# Altium footprint library CMRat_GEN2.8.PcbLib: 50 footprints (part 1 of 4)
Each footprint in its own frame and in the unit in brackets; x right, y up, seen from the top. Pads: shape width x height; smd on the part's side, far side on the other; paste and mask are expansions set on the pad; w line width, h text height; cw(c..) or ccw(c..) is an arc to the next point about the centre after c.
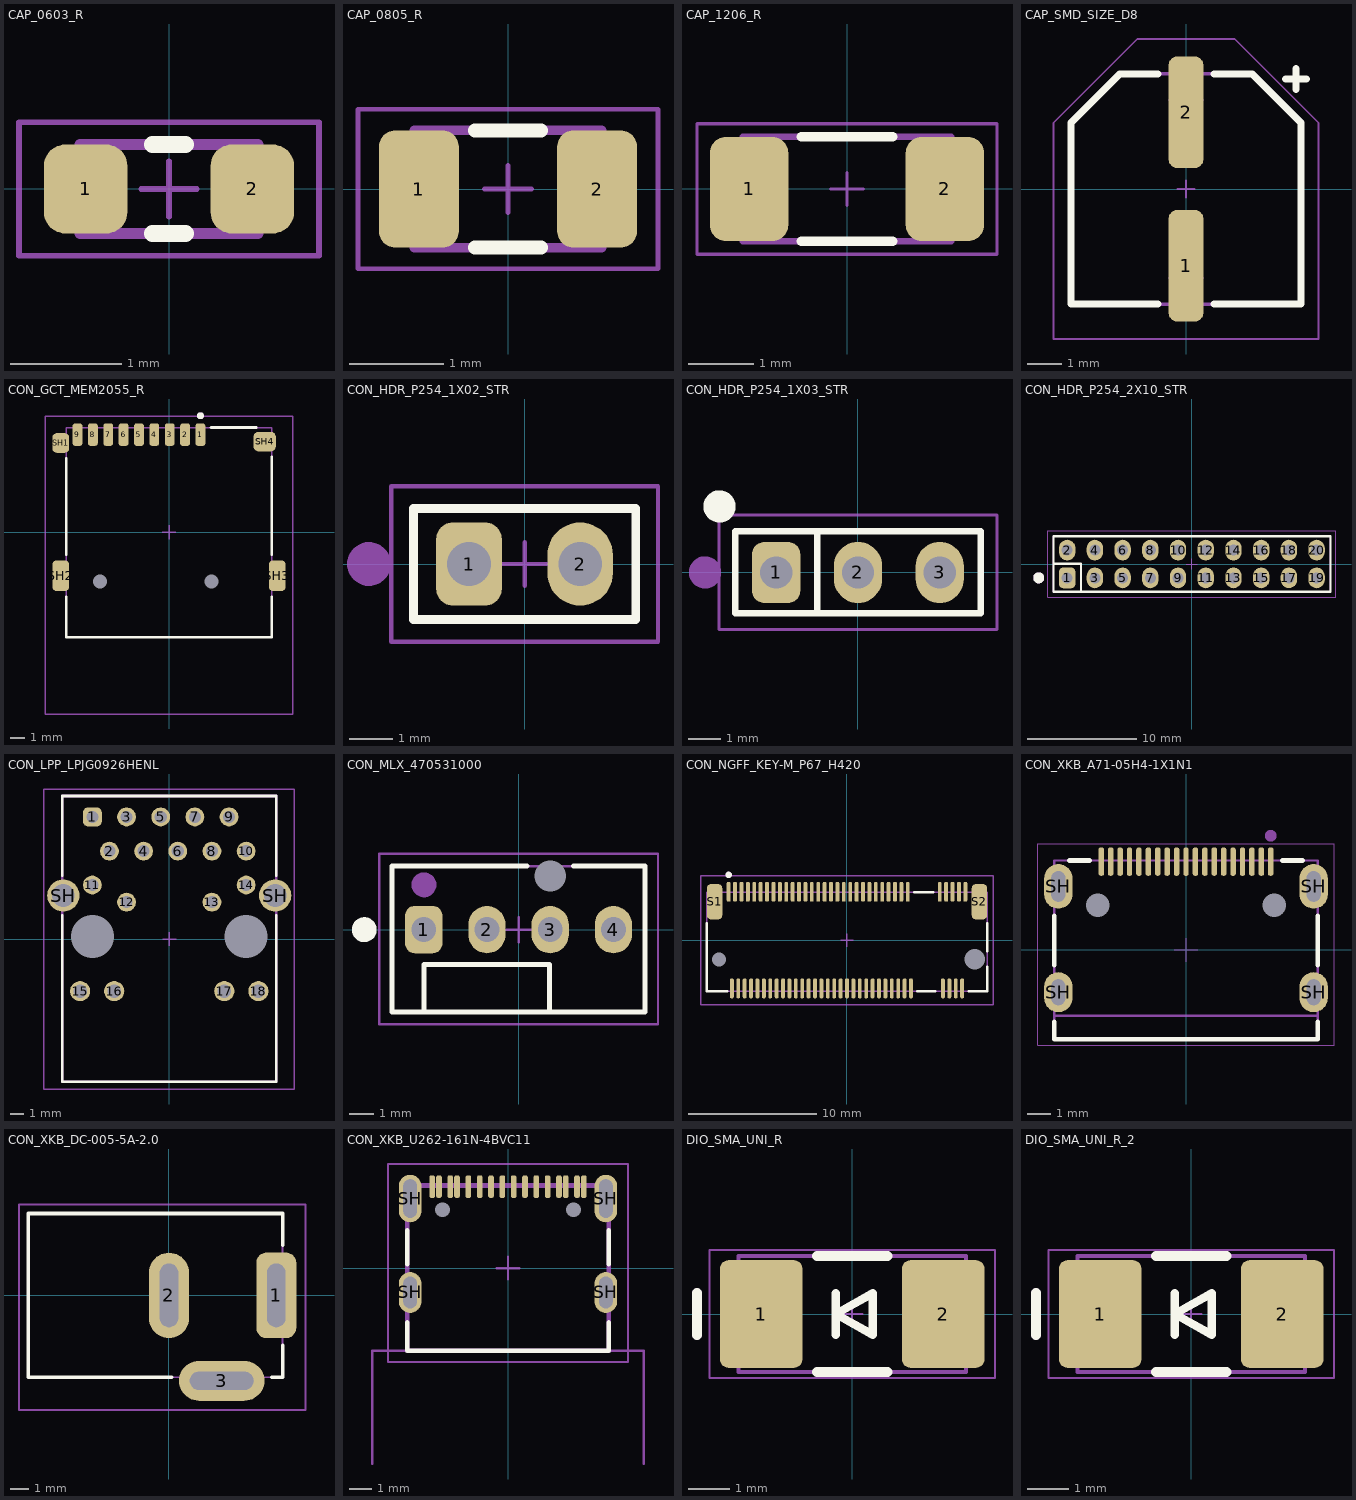
[diagram p0: the footprints below, top view; thin cyan lines are the x and y axes]

## CAP_0603_R [mm]
height 10.7
pads (2):
  rrect50% 0.75x0.8 smd: 1(-0.75,0) 2(0.75,0)
Top Overlay:
  lines w0.15: -0.15,-0.4 0.15,-0.4 ; -0.15,0.4 0.15,0.4
Mechanical 19:
  lines w0.1: -0.8,-0.4 -0.8,0.4 0.8,0.4 0.8,-0.4 -0.8,-0.4
  text ".Designator" at 0.95,-0.65 h1
Mechanical 23:
  lines w0.05: -0.25,0 0.25,0 ; 0,-0.25 0,0.25 ; -1.35,-0.6 -1.35,0.6 1.35,0.6 1.35,-0.6 -1.35,-0.6
3D body "CAPC1608X_0603.step": height 0.57, standoff 0, extent -0.8,-0.41 0.8,0.41

## CAP_0805_R [mm]
height 10.7
pads (2):
  rrect40% 0.85x1.25 smd: 1(-0.95,0) 2(0.95,0)
Top Overlay:
  lines w0.15: -0.35,-0.625 0.35,-0.625 ; -0.35,0.625 0.35,0.625
Mechanical 19:
  lines w0.1: -1,-0.625 -1,0.625 1,0.625 1,-0.625 -1,-0.625
  text ".Designator" at -1,1.05 h1
Mechanical 23:
  lines w0.05: -0.25,0 0.25,0 ; 0,-0.25 0,0.25 ; -1.6,-0.85 -1.6,0.85 1.6,0.85 1.6,-0.85 -1.6,-0.85
3D body "CAP0805.step": height 0.6, standoff 0, extent -1,-0.625 1,0.625

## CAP_1206_R [mm]
pads (2):
  rrect40% 1.2x1.6 smd paste+0: 1(-1.5,0)
  rrect40% 1.2x1.6 smd: 2(1.5,0)
Top Overlay:
  lines w0.15: -0.7,-0.8 0.7,-0.8 ; -0.7,0.8 0.7,0.8
Mechanical 19:
  lines w0.1: -1.6,-0.8 1.6,-0.8 1.6,0.8 -1.6,0.8 -1.6,-0.8
  text ".Designator" at -2.65,0.85 h1
Mechanical 23:
  lines w0.05: -0.25,0 0.25,0 ; 0,-0.25 0,0.25 ; -2.3,-1 -2.3,1 2.3,1 2.3,-1 -2.3,-1
3D body "CAP1206.step": height 0.79, standoff 0.01, extent -1.6,-0.8 1.6,0.8

## CAP_SMD_SIZE_D8 [mm]
height 10.7
pads (2):
  rrect50% 1x3.2 smd: 1(0,-2.2) 2(0,2.2)
Top Overlay:
  lines w0.2: -0.8,-3.3 -3.3,-3.3 -3.3,1.9 -1.9,3.3 -0.8,3.3 ; 0.8,-3.3 3.3,-3.3 3.3,1.9 1.9,3.3 0.8,3.3 ; 2.85,3.15 3.45,3.15 ; 3.15,2.85 3.15,3.45
Mechanical 19:
  lines w0.1: -3.3,-3.3 3.3,-3.3 3.3,1.9 1.9,3.3 -1.9,3.3 -3.3,1.9 -3.3,-3.3
  lines w0.2: -0.4,-2.55 0.4,-2.55 ; -0.4,2.55 0.4,2.55 ; 0,2.15 0,2.95
  text ".Designator" at 1.35,0.45 h1.4
Mechanical 23:
  lines w0.05: -0.25,0 0.25,0 ; 0,-0.25 0,0.25 ; -3.8,-4.3 3.8,-4.3 3.8,1.9 1.4,4.3 -1.4,4.3 -3.8,1.9 -3.8,-4.3
3D body "CAP Size D8.step": height 7.71, standoff -0.01, extent -3.3,-3.5 3.3,3.5

## CON_GCT_MEM2055_R [mm]
pads (15):
  rrect50% 0.7x1.6 smd: 1(2.25,7) 2(1.15,7) 3(0.05,7) 4(-1.05,7) 5(-2.15,7) 6(-3.25,7) 7(-4.35,7) 8(-5.45,7) 9(-6.55,7)
  round 0 hole 1 unplated paste+0 mask+0.1: MH(-4.95,-3.5) MH(3.05,-3.5)
  rrect50% 1.2x1.4 smd: SH1(-7.75,6.4)
  rrect50% 1.2x2.2 smd: SH2(-7.75,-3.1) SH3(7.75,-3.1)
  rrect50% 1.6x1.4 smd: SH4(6.85,6.5)
Top Overlay:
  circle w0.25: c2.25,8.35 r0.125
  lines w0.2: -7.35,-4.6 -7.35,-7.5 7.35,-7.5 7.35,-4.6 ; -7.35,-1.6 -7.35,5.3 ; 3,7.5 6.25,7.5 ; 7.35,-1.6 7.35,5.4
Mechanical 19:
  circle w0.25: c2.25,8.35 r0.125
  lines w0.1: -7.35,-7.5 -7.35,7.5 7.35,7.5 7.35,-7.5 -7.35,-7.5
  text ".Designator" at -2.1,-9.3 h2
Mechanical 23:
  lines w0.1: -0.5,0 0.5,0 ; 0,-0.5 0,0.5 ; -8.85,-13 -8.85,8.3 8.85,8.3 8.85,-13 -8.85,-13
3D body "GCT_MEM2055-00-190-01-A_revG.step": height 1.85, standoff -0.6, extent -8,-7.5 8,7.75

## CON_HDR_P254_1X02_STR [mm]
height 7.12
pads (2):
  rrect50% 1.5x1.9 hole 1: 1(-1.27,0)
  oval 1.5x1.9 hole 1: 2(1.27,0)
Top Overlay:
  lines w0.2: -2.54,-1.27 2.54,-1.27 2.54,1.27 -2.54,1.27 -2.54,-1.27
Mechanical 21:
  circle w0.5: c-3.556,0 r0.25
  lines w0.1: -2.54,-1.27 -2.54,1.27 2.54,1.27 2.54,-1.27 -2.54,-1.27
  text ".Designator" at 1.75,-1.6 h2
Mechanical 23:
  lines w0.1: -0.5,0 0.5,0 ; 0,-0.5 0,0.5 ; -3.048,-1.778 3.048,-1.778 3.048,1.778 -3.048,1.778 -3.048,-1.778
3D body "Pin Header 1X2.step": height 8.57, standoff -2.97, extent -2.54,-1.27 2.54,1.27

## CON_HDR_P254_1X03_STR [mm]
height 13.25
pads (3):
  rrect50% 1.5x1.9 hole 1: 1(-2.54,0)
  oval 1.5x1.9 hole 1: 2(0,0) 3(2.54,0)
Top Overlay:
  circle w0.5: c-4.3,2.05 r0.25
  lines w0.2: -1.27,-1.27 -1.27,1.27 ; -3.81,-1.27 -3.81,1.28 3.81,1.28 3.81,-1.27 -3.81,-1.27
Mechanical 21:
  circle w0.5: c-4.75,0 r0.25
  lines w0.1: -3.81,1.27 3.81,1.27 3.81,-1.27 -3.81,-1.27 -3.81,1.275 ; -1.27,-1.27 -1.27,1.275
  text ".Designator" at 1.6,-1.5 h1.5
Mechanical 23:
  lines w0.1: -0.5,0 0.5,0 ; 0,-0.5 0,0.5 ; -4.318,-1.773 -4.318,1.783 4.318,1.783 4.318,-1.773 -4.318,-1.773
3D body "Wurth_61300311121.stp": height 8.57, standoff -2.97, extent -3.81,-1.27 3.81,1.27

## CON_HDR_P254_2X10_STR [mm]
pads (20):
  rrect50% 1.5x1.9 hole 1: 1(-11.43,-1.275)
  oval 1.5x1.9 hole 1: 2(-11.43,1.275) 3(-8.89,-1.275) 4(-8.89,1.275) 5(-6.35,-1.275) 6(-6.35,1.275) 7(-3.81,-1.275) 8(-3.81,1.275) 9(-1.27,-1.275) 10(-1.27,1.275) 11(1.27,-1.275) 12(1.27,1.275) 13(3.81,-1.275) 14(3.81,1.275) 15(6.35,-1.275) 16(6.35,1.275) 17(8.89,-1.27) 18(8.89,1.275) 19(11.43,-1.275) 20(11.43,1.275)
Top Overlay:
  circle w0.5: c-14.04,-1.27 r0.25
  lines w0.2: -12.68,0.025 -10.18,0.025 ; -10.16,-2.545 -10.16,-0.005 ; 12.7,-2.555 12.7,2.535 ; 12.7,-2.545 -12.7,-2.545 -12.7,2.545 12.7,2.545
Mechanical 21:
  circle w0.5: c-14.04,-1.27 r0.25
  lines w0.1: -12.695,0 -10.16,0 -10.16,-2.545 ; 12.7,-2.555 12.7,2.525 ; 12.7,-2.545 -12.7,-2.545 -12.7,2.535 12.7,2.535
  text ".Designator" at -2.4,2.805 h2
Mechanical 23:
  lines w0.1: -0.5,0 0.5,0 ; 0,-0.5 0,0.5 ; 13.19,3.048 -13.208,3.048 -13.208,-3.048 13.208,-3.048 13.208,3.038
3D body "61302021121.stp": height 8.59, standoff -2.95, extent -12.7,-2.54 12.7,2.54

## CON_LPP_LPJG0926HENL [mm]
height 13.3
pads (22):
  rrect50% 1.4x1.4 hole 0.9: 1(-5.721,9.073)
  round 1.4 hole 0.9: 2(-4.451,6.533) 3(-3.181,9.073) 4(-1.911,6.533) 5(-0.641,9.073) 6(0.629,6.533) 7(1.899,9.073) 8(3.169,6.533) 9(4.439,9.073) 10(5.709,6.533) 11(-5.721,4.013) 12(-3.181,2.743) 13(3.169,2.743) 14(5.709,4.013)
  round 1.5 hole 1: 15(-6.636,-3.877) 16(-4.096,-3.877) 17(4.084,-3.877) 18(6.624,-3.877)
  round 0 hole 3.2 unplated mask+0.1: MH1(-5.721,0.183) MH2(5.709,0.183)
  round 2.4 hole 1.7: SH(-7.881,3.233) SH(7.869,3.233)
Top Overlay:
  lines w0.2: -7.971,1.743 -7.971,-10.617 7.959,-10.617 7.959,1.743 ; -7.971,4.723 -7.971,10.633 7.959,10.633 7.959,4.723
Mechanical 21:
  lines w0.2: -7.971,-10.617 -7.971,10.633 7.959,10.633 7.959,-10.617 -7.971,-10.617
  text ".Designator" at -3.031,-7.167 h3
Mechanical 23:
  lines w0.1: -0.5,0 0.5,0 ; 0,-0.5 0,0.5 ; -9.35,-11.15 9.3,-11.15 9.3,11.15 -9.35,11.15 -9.35,-11.15
3D body "LPJG0926HENL.stp": height 13.45, standoff -3.85, extent -8.115,-10.625 8.115,10.625

## CON_MLX_470531000 [mm]
height 10.7
pads (5):
  rrect50% 1.5x1.9 hole 1: 1(-3.81,0)
  oval 1.5x1.9 hole 1: 2(-1.27,0) 3(1.27,0) 4(3.81,0)
  round 0 hole 1.25 unplated mask+0.1: MH(1.27,2.16)
Top Overlay:
  circle w0.5: c-6.2,0 r0.25
  lines w0.2: -3.8,-3.3 -3.8,-1.4 1.25,-1.4 1.25,-3.3 ; 0.34,2.55 -5.08,2.55 -5.08,-3.3 5.08,-3.3 5.08,2.55 2.2,2.55
Mechanical 21:
  circle w0.5: c-3.8,1.8 r0.25
  lines w0.1: -3.8,-3.3 -3.8,-1.4 1.26,-1.4 1.26,-3.3 ; -5.08,-3.3 -5.08,2.55 5.08,2.55 5.08,-3.3 -5.08,-3.3
  text ".Designator" at 6.8,-2.35 h2
Mechanical 23:
  lines w0.1: -0.5,0 0.5,0 ; 0,-0.5 0,0.5 ; -5.6,-3.8 5.6,-3.8 5.6,3.05 -5.6,3.05 -5.6,-3.8
3D body "Molex_470531000.stp": height 10.1, standoff -3.4, extent -5.1,-3.3 5.1,2.54

## CON_NGFF_KEY-M_P67_H420 [mm]
pads (71):
  rrect75% 0.3x1.55 smd: 1(-9.25,3.775) 2(-9,-3.775) 3(-8.75,3.775) 4(-8.5,-3.775) 5(-8.25,3.775) 6(-8,-3.775) 7(-7.75,3.775) 8(-7.5,-3.775) 9(-7.25,3.775) 10(-7,-3.775) 11(-6.75,3.775) 12(-6.5,-3.775) 13(-6.25,3.775) 14(-6,-3.775) 15(-5.75,3.775) 16(-5.5,-3.775) 17(-5.25,3.775) 18(-5,-3.775) 19(-4.75,3.775) 20(-4.5,-3.775) 21(-4.25,3.775) 22(-4,-3.775) 23(-3.75,3.775) 24(-3.5,-3.775) 25(-3.25,3.775) 26(-3,-3.775) 27(-2.75,3.775) 28(-2.5,-3.775) 29(-2.25,3.775) 30(-2,-3.775) 31(-1.75,3.775) 32(-1.5,-3.775) 33(-1.25,3.775) 34(-1,-3.775) 35(-0.75,3.775) 36(-0.5,-3.775) 37(-0.25,3.775) 38(0,-3.775) 39(0.25,3.775) 40(0.5,-3.775) 41(0.75,3.775) 42(1,-3.775) 43(1.25,3.775) 44(1.5,-3.775) 45(1.75,3.775) 46(2,-3.775) 47(2.25,3.775) 48(2.5,-3.775) 49(2.75,3.775) 50(3,-3.775) 51(3.25,3.775) 52(3.5,-3.775) 53(3.75,3.775) 54(4,-3.775) 55(4.25,3.775) 56(4.5,-3.775) 57(4.75,3.775) 58(5,-3.775) 67(7.25,3.775) 68(7.5,-3.775) 69(7.75,3.775) 70(8,-3.775) 71(8.25,3.775) 72(8.5,-3.775) 73(8.75,3.775) 74(9,-3.775) 75(9.25,3.775)
  rrect50% 1.2x2.75 smd: S1(-10.35,3) S2(10.35,3)
  round 0 hole 1.1 unplated mask+0.1: ""(-10,-1.5)
  round 0 hole 1.6 unplated mask+0.1: ""(10,-1.5)
Top Overlay:
  circle w0.25: c-9.25,5.1 r0.125
  lines w0.2: -10.95,1.3 -10.95,-4 -9.35,-4 ; 5.25,3.75 6.75,3.75 ; 5.5,-4 6.9,-4 ; 9.5,-4 10.95,-4 10.95,-2.1 ; 10.95,-0.85 10.95,1.3
Mechanical 19:
  circle w0.25: c-9.25,5.1 r0.125
  lines w0.1: -10.95,-4 10.95,-4 10.95,3.75 -10.95,3.75 -10.95,-4
  text ".Designator" at -11.35,-2.1 h2
Mechanical 23:
  lines w0.1: -0.5,0 0.5,0 ; 0,-0.5 0,0.5 ; -11.45,-5.05 11.45,-5.05 11.45,5.05 -11.45,5.05 -11.45,-5.05
3D body "TE_Connectivity_1-2199230-6.stp": height 4.09, standoff -0.62, extent -10.95,-4.35 10.95,4.35

## CON_XKB_A71-05H4-1X1N1 [mm] "Mini HDMI SMT Horizontal"
height 3.2
pads (25):
  rrect75% 0.23x1.2 smd: 1(3.6,3.75) 2(3.2,3.75) 3(2.8,3.75) 4(2.4,3.75) 5(2,3.75) 6(1.6,3.75) 7(1.2,3.75) 8(0.8,3.75) 9(0.4,3.75) 10(0,3.75) 11(-0.4,3.75) 12(-0.8,3.75) 13(-1.2,3.75) 14(-1.6,3.75) 15(-2,3.75) 16(-2.4,3.75) 17(-2.8,3.75) 18(-3.2,3.75) 19(-3.6,3.75)
  round 0 hole 1 unplated mask+0.1: MH1(-3.75,1.9) MH2(3.75,1.9)
  oval 1.2x1.7 hole 0.6 slot 1.1 at 90 deg: SH(-5.425,-1.8) SH(5.425,-1.8)
  oval 1.2x1.9 hole 0.6 slot 1.3 at 90 deg: SH(-5.425,2.7) SH(5.425,2.7)
Top Overlay:
  lines w0.2: -5.6,-3.05 -5.6,-3.8 5.6,-3.8 5.6,-3.05 ; -5.6,-0.65 -5.6,1.45 ; -4.95,3.8 -4.1,3.8 ; 4.1,3.8 4.95,3.8 ; 5.6,-0.65 5.6,1.45
Mechanical 2:
  lines w0.1: -5.6,-2.8 5.6,-2.8
  text "PCB Edge" at -1.831,-3.706 h0.61
Mechanical 19:
  circle w0.25: c3.6,4.85 r0.125
  lines w0.1: -5.6,-3.8 5.6,-3.8 5.6,3.8 -5.6,3.8 -5.6,-3.8
  text ".Designator" at -2.1,-1.15 h2
Mechanical 23:
  lines w0.05: -0.5,0 0.5,0 ; 0,-0.5 0,0.5 ; -6.3,-4.05 6.3,-4.05 6.3,4.5 -6.3,4.5 -6.3,-4.05
3D body: height 0, standoff -2, extent 3.353,1.501 4.15,2.299
3D body: height 0, standoff -2, extent -4.147,1.501 -3.35,2.299
3D body "685119136923.stp": height 3.3, standoff -2.15, extent -5.625,-3.8 5.625,4.102

## CON_XKB_DC-005-5A-2.0 [mm]
height 10.7
pads (3):
  rrect50% 2.2x4.7 hole 1 slot 3.5 at 90 deg: 1(5.9,0)
  oval 2.2x4.7 hole 1 slot 3.5 at 90 deg: 2(0,0)
  oval 4.7x2.2 hole 1 slot 3.5 at 0 deg: 3(2.9,-4.7)
Top Overlay:
  lines w0.2: 0.15,-4.5 -7.75,-4.5 -7.75,4.5 6.25,4.5 6.25,2.75 ; 5.65,-4.5 6.25,-4.5 6.25,-2.75
Mechanical 21:
  lines w0.1: -7.75,-4.5 6.25,-4.5 6.25,4.5 -7.75,4.5 -7.75,-4.5
  text ".Designator" at 2.2,1.75 h2
Mechanical 23:
  lines w0.1: -0.5,0 0.5,0 ; 0,-0.5 0,0.5 ; -8.25,-6.3 -8.25,5 7.5,5 7.5,-6.3 -8.25,-6.3
3D body "dc-005-5a-20.stp": height 11.1, standoff -3.5, extent -7.75,-4.9 6.25,4.5

## CON_XKB_U262-161N-4BVC11 [mm]
pads (22):
  rrect75% 0.25x1 smd: A1(-3.35,3.6) A4(-2.55,3.6) A5(-1.25,3.6) A6(-0.25,3.6) A7(0.25,3.6) A8(1.25,3.6) A9(2.55,3.6) A12(3.35,3.6) B1(3.05,3.6) B4(2.25,3.6) B5(1.75,3.6) B6(0.75,3.6) B7(-0.75,3.6) B8(-1.75,3.6) B9(-2.25,3.6) B12(-3.05,3.6)
  round 0 hole 0.65 unplated mask+0.1: MH1(-2.89,2.575) MH2(2.89,2.575)
  rrect100% 1x1.8 hole 0.6 slot 1.4 at 90 deg: SH(-4.32,-1.075) SH(4.32,-1.075)
  rrect100% 1x2.1 hole 0.6 slot 1.7 at 90 deg: SH(-4.32,3.075) SH(4.32,3.075)
Top Overlay:
  lines w0.2: -4.45,-2.4 -4.45,-3.65 4.45,-3.65 4.45,-2.4 ; -4.45,0.175 -4.45,1.675 ; 4.45,0.175 4.45,1.675
Mechanical 17:
  lines w0.1: -6,-8.65 -6,-3.65 6,-3.65 6,-8.65
  text "PCB Edge" at -2.2,-4.8 h0.61
Mechanical 19:
  lines w0.2: -4.45,-3.65 4.45,-3.65 4.45,3.65 -4.45,3.65 -4.45,-3.65
  text ".Designator" at -1.8,-1.55 h2
Mechanical 23:
  lines w0.1: -0.5,0 0.5,0 ; 0,-0.5 0,0.5 ; -5.3,-4.15 5.3,-4.15 5.3,4.6 -5.3,4.6 -5.3,-4.15
3D body "XKB-Connectivity_U262-161N-4BVC11.stp": height 3.3, standoff -0.96, extent -4.45,-3.66 4.45,3.9

## DIO_SMA_UNI_R [mm]
height 10.7
pads (2):
  rrect20% 2x2.6 smd: 1(-2.2,0)
  rrect20% 2x2.6 smd paste+0: 2(2.2,0)
Top Overlay:
  lines w0.2: -0.4,-0.5 -0.4,0.5 ; -0.4,0 0.5,-0.5 0.5,0.5 -0.4,0
  lines w0.25: -3.75,-0.5 -3.75,0.5 ; -0.85,-1.4 0.85,-1.4 ; -0.85,1.4 0.85,1.4
Mechanical 19:
  lines w0.1: -0.4,-0.5 -0.4,0.5 ; -2.75,-1.4 -2.75,1.4 2.75,1.4 2.75,-1.4 -2.75,-1.4 ; -0.4,0 0.5,0.5 0.5,-0.5 -0.4,0
  lines w0.25: -3.75,-0.5 -3.75,0.5
  text ".Designator" at 2.1,-1.95 h2
Mechanical 23:
  lines w0.05: -0.25,0 0.25,0 ; 0,-0.25 0,0.25 ; -3.45,-1.55 3.45,-1.55 3.45,1.55 -3.45,1.55 -3.45,-1.55
3D body "DO-214AC(SMA).step": height 2.24, standoff -0.04, extent -2.743,-1.397 2.743,1.397

## DIO_SMA_UNI_R_2 [mm]
pads (2):
  rrect20% 2x2.6 smd: 1(-2.2,0)
  rrect20% 2x2.6 smd paste+0: 2(2.2,0)
Top Overlay:
  lines w0.2: -0.4,-0.5 -0.4,0.5 ; -0.4,0 0.5,-0.5 0.5,0.5 -0.4,0
  lines w0.25: -3.75,-0.5 -3.75,0.5 ; -0.85,-1.4 0.85,-1.4 ; -0.85,1.4 0.85,1.4
Mechanical 19:
  lines w0.1: -0.4,-0.5 -0.4,0.5 ; -2.75,-1.4 2.75,-1.4 2.75,1.4 -2.75,1.4 -2.75,-1.4 ; -0.4,0 0.5,-0.5 0.5,0.5 -0.4,0
  lines w0.25: -3.75,-0.5 -3.75,0.5
  text ".Designator" at 2.15,3.1 h2
Mechanical 23:
  lines w0.05: -0.25,0 0.25,0 ; 0,-0.25 0,0.25 ; -3.45,-1.55 -3.45,1.55 3.45,1.55 3.45,-1.55 -3.45,-1.55
3D body "DO-214AC(SMA).step": height 2.24, standoff -0.04, extent -2.743,-1.397 2.743,1.397